# Altium footprint library 430 integreted.PcbLib: 281 footprints (part 1 of 18)
Each footprint in its own frame and in the unit in brackets; x right, y up, seen from the top. Pads: shape width x height; smd on the part's side, far side on the other; paste and mask are expansions set on the pad; w line width, h text height; cw(c..) or ccw(c..) is an arc to the next point about the centre after c.
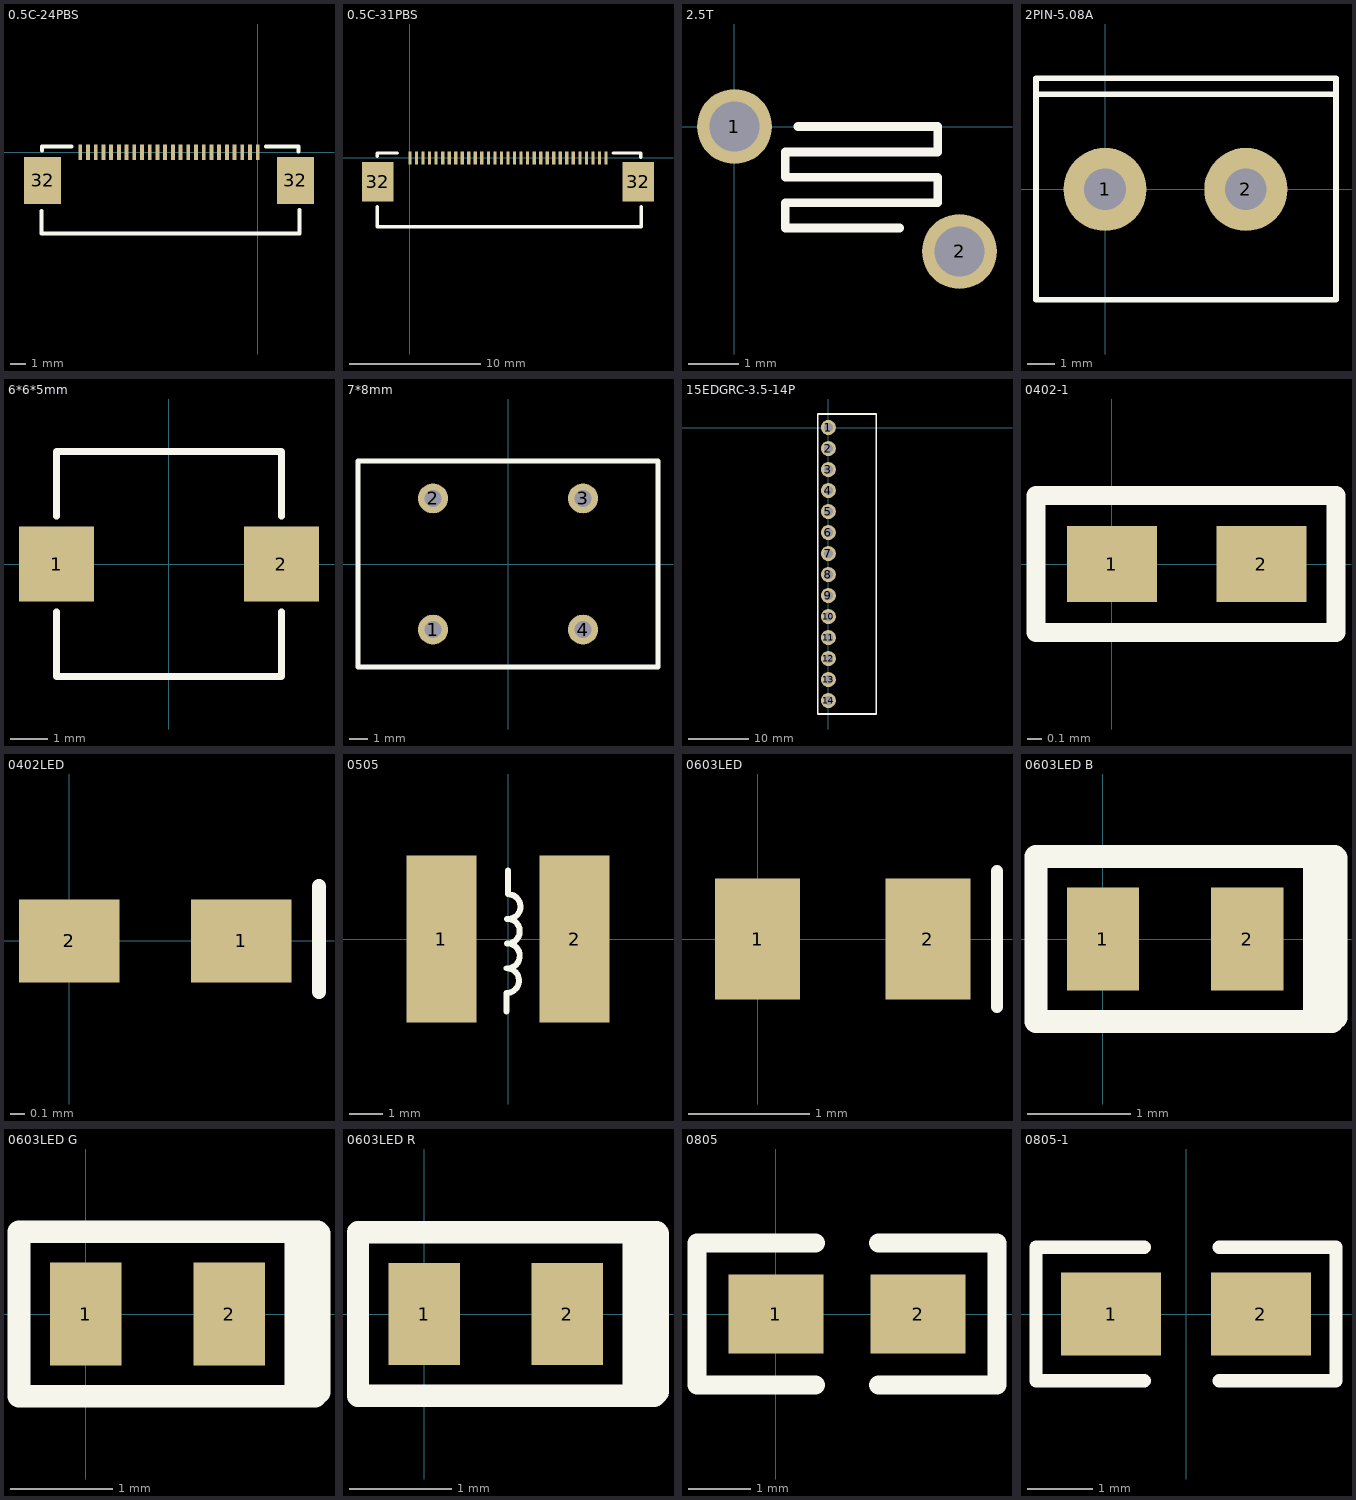
[diagram p0: the footprints below, top view; thin cyan lines are the x and y axes]

## 0.5C-24PBS [mm]
pads (26):
  rect 0.25x1 smd: 1(0,0) 2(-0.5,0) 3(-1,0) 4(-1.5,0) 5(-2,0) 6(-2.5,0) 7(-3,0) 8(-3.5,0) 9(-4,0) 10(-4.5,0) 11(-5,0) 12(-5.5,0) 13(-6,0) 14(-6.5,0) 15(-7,0) 16(-7.5,0) 17(-8,0) 18(-8.5,0) 19(-9,0) 20(-9.5,0) 21(-10,0) 22(-10.5,0) 23(-11,0) 24(-11.5,0)
  rect 2.4x3.05 smd: 32(-13.95,-1.825) 32(2.45,-1.825)
Top Overlay:
  lines w0.254: -14.021,-3.81 -14.021,-5.258 2.704,-5.258 2.704,-3.734 ; -13.995,0.102 -13.995,0.381 -12.065,0.381 ; 0.545,0.381 2.653,0.381 2.653,0.051

## 0.5C-31PBS [mm]
pads (33):
  rect 0.25x1 smd: 1(15,0) 2(14.5,0) 3(14,0) 4(13.5,0) 5(13,0) 6(12.5,0) 7(12,0) 8(11.5,0) 9(11,0) 10(10.5,0) 11(10,0) 12(9.5,0) 13(9,0) 14(8.5,0) 15(8,0) 16(7.5,0) 17(7,0) 18(6.5,0) 19(6,0) 20(5.5,0) 21(5,0) 22(4.5,0) 23(4,0) 24(3.5,0) 25(3,0) 26(2.5,0) 27(2,0) 28(1.5,0) 29(1,0) 30(0.5,0) 31(0,0)
  rect 2.4x3.05 smd: 32(-2.45,-1.825) 32(17.45,-1.825)
Top Overlay:
  lines w0.254: -2.515,-3.734 -2.515,-5.258 17.704,-5.258 17.704,-3.734 ; -2.515,0.102 -2.515,0.381 -0.977,0.381 ; 15.545,0.381 17.653,0.381 17.653,0.051

## 2.5T [mm]
pads (2):
  round 1.5 hole 1: 1(0,0) 2(4.5,-2.5)
Top Overlay:
  lines w0.178: 1.27,0 4.064,0 4.064,-0.508 1.016,-0.508 1.016,-1.016 4.064,-1.016 4.064,-1.524 1.016,-1.524 1.016,-2.032 3.302,-2.032

## 2PIN-5.08A [mm]
pads (2):
  round 3 hole 1.5: 1(0,0) 2(5.08,0)
Top Overlay:
  lines w0.2: -2.489,3.429 8.255,3.429 ; -2.489,-3.988 8.331,-3.988 8.331,4.013 -2.489,4.013 -2.489,-3.988
3D body: height 14.2, standoff -3.5, extent -2.54,-5.205 8.361,4.595

## 6*6*5mm [mm]
pads (2):
  rect 2x2 smd: 1(-3,0) 2(3,0)
Top Overlay:
  lines w0.178: -3,-1.27 -3,-3 3,-3 3,-1.27 ; -3,1.27 -3,3 3,3 3,1.27
3D body: height 5, standoff 0, extent -3,-3 3,3

## 7*8mm [mm]
pads (4):
  round 1.6 hole 0.9: 1(-4,-3.5) 2(-4,3.5) 3(4,3.5) 4(4,-3.5)
Top Overlay:
  lines w0.254: -8,-5.5 -8,5.5 8,5.5 8,-5.5 -8,-5.5

## 15EDGRC-3.5-14P [mm]
pads (14):
  round 2.5 hole 1.5: 1(0,0) 2(0,-3.5) 3(0,-7) 4(0,-10.5) 5(0,-14) 6(0,-17.5) 7(0,-21) 8(0,-24.5) 9(0,-28) 10(0,-31.5) 11(0,-35) 12(0,-38.5) 13(0,-42) 14(0,-45.5)
Top Overlay:
  lines w0.254: -1.778,-47.735 -1.778,2.25 8,2.25 8,-47.735 -1.778,-47.735

## 0402-1 [mm]
pads (2):
  rect 0.6x0.51 smd: 1(0,0) 2(1,0)
Top Overlay:
  lines w0.127: -0.508,-0.457 1.499,-0.457 1.499,0.457 -0.508,0.457 -0.508,-0.457

## 0402LED [mm]
pads (2):
  rect 0.7x0.58 smd: 1(1.2,0) 2(0,0)
Top Overlay:
  lines w0.1: 1.743,-0.356 1.743,0.381
3D body: height 0.45, standoff 0, extent 0.095,-0.25 1.105,0.25

## 0505 [mm]
pads (2):
  rect 2.1x5 smd: 1(-2,0) 2(2,0)
Top Overlay:
  lines w0.178: -0.05,-2.175 -0.05,-1.619 ccw(c-0.041,-1.249) -0.049,-0.878 ccw(c-0.017,-0.509) -0.025,-0.138 ccw(c-0.018,0.233) -0.027,0.604 ccw(c0.004,0.973) -0.005,1.344 -0.005,2.055
3D body: height 4.5, standoff -0.05, extent -2.895,-2.599 2.874,2.601

## 0603LED [mm]
pads (2):
  rect 0.7x1 smd: 1(0,0) 2(1.4,0)
Top Overlay:
  lines w0.1: 1.97,-0.559 1.97,0.559
3D body: height 0.6, standoff 0, extent -0.11,-0.4 1.51,0.4

## 0603LED B [mm]
pads (2):
  rect 0.7x1 smd: 1(0,0) 2(1.4,0)
Top Overlay:
  lines w0.22: 2.248,0.8 2.05,0.8 ; 2.261,0.787 2.261,-0.762 2.223,-0.8 2.05,-0.8 ; 2.05,-0.8 2.05,0.8 ; 2.05,-0.8 -0.65,-0.8 -0.65,0.8 2.05,0.8 ; 2.083,-0.457 2.083,0.66 2.083,-0.457
3D body: height 0.6, standoff 0, extent -0.099,-0.4 1.521,0.4

## 0603LED G [mm]
pads (2):
  rect 0.7x1 smd: 1(0,0) 2(1.4,0)
Top Overlay:
  lines w0.22: 2.262,0.8 2.064,0.8 2.064,-0.8 2.237,-0.8 2.275,-0.762 2.275,0.787 ; -0.65,-0.8 -0.65,0.8 2.05,0.8 2.05,-0.8 -0.65,-0.8 ; 2.097,-0.457 2.097,0.66 2.097,-0.457
3D body: height 0.6, standoff 0, extent -0.11,-0.4 1.51,0.4

## 0603LED R [mm]
pads (2):
  rect 0.7x1 smd: 1(0,0) 2(1.4,0)
Top Overlay:
  lines w0.22: 2.061,-0.8 2.061,0.8 ; 2.273,0.8 2.075,0.8 2.075,-0.8 2.248,-0.8 2.286,-0.762 2.286,0.787 ; -0.65,-0.8 2.05,-0.8 2.05,0.8 -0.65,0.8 -0.65,-0.8 ; 2.108,-0.457 2.108,0.66 2.108,-0.457
3D body: height 0.6, standoff 0, extent -0.099,-0.4 1.521,0.4

## 0805 [mil]
pads (2):
  rect 60x50 smd: 1(0,0) 2(90,0)
Top Overlay:
  lines w12: 25,-45 -50,-45 -50,45 25,45 ; 65,-45 140,-45 140,45 65,45

## 0805-1 [mil]
pads (2):
  rect 60x50 smd: 1(-45,0) 2(45,0)
Top Overlay:
  lines w8: -25,-40 -90,-40 -90,40 -25,40 ; 20,-40 90,-40 90,40 20,40
3D body: height 21.65, standoff 0, extent -39.37,-24.8 39.37,24.81